# Altium footprint library connectors_terminal.PcbLib: 42 footprints (part 1 of 3)
Each footprint in its own frame and in the unit in brackets; x right, y up, seen from the top. Pads: shape width x height; smd on the part's side, far side on the other; paste and mask are expansions set on the pad; w line width, h text height; cw(c..) or ccw(c..) is an arc to the next point about the centre after c.
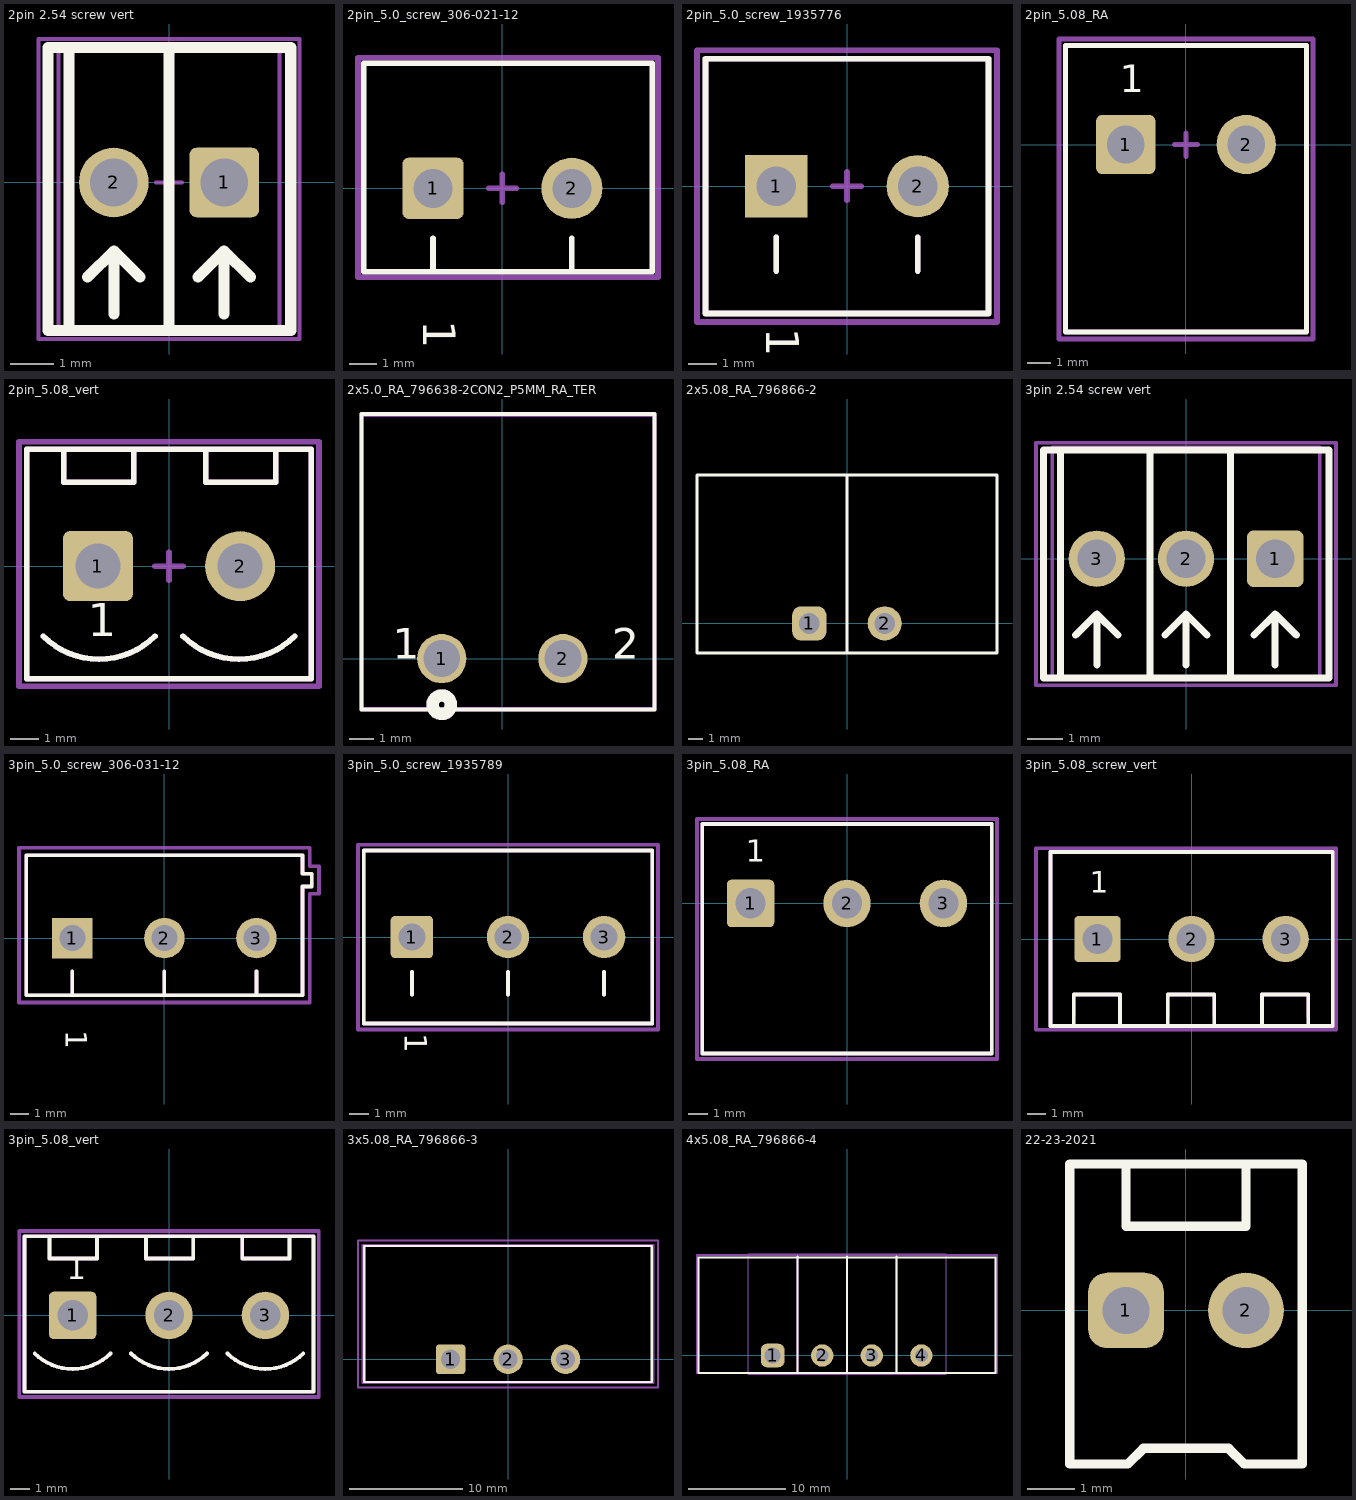
[diagram p0: the footprints below, top view; thin cyan lines are the x and y axes]

## 2pin 2.54 screw vert [mm] "XY308-2.54-02P, DG308-2.54-02P-14-00AH"
height 8
pads (2):
  rrect20% 1.6x1.6 hole 1.1: 1(1.27,0)
  round 1.6 hole 1.1: 2(-1.27,0)
Top Overlay:
  lines w0.254: -2.3,-3.4 -2.3,3.1 ; -1.87,-2.175 -1.27,-1.575 ; -1.27,-3.025 -1.27,-1.575 ; -0.67,-2.175 -1.27,-1.575 ; 0,-3.4 0,3.1 ; 0.67,-2.175 1.27,-1.575 ; 1.27,-3.025 1.27,-1.575 ; 1.87,-2.175 1.27,-1.575 ; -2.78,-3.4 -2.78,3.1 2.8,3.1 2.8,-3.4 -2.78,-3.4
M3_comm_top:
  text ".comment" at -0.9,-0.3 h1
M5_asm_top:
  lines w0.1: -2.54,-3.429 2.54,-3.429 2.54,3.175 -2.54,3.175 -2.54,-3.429
  text ".Designator" at -1.47,2.1 h1
M7_courtyard_top:
  lines w0.1: -0.3,0 0.3,0 ; 0,-0.4 0,0.4 ; -3,-3.6 -3,3.3 3,3.3 3,-3.6 -3,-3.6
M11_dimension:
  lines w0.1: -2.54,-3.429 -2.54,3.175 2.54,3.175 2.54,-3.429 -2.54,-3.429
3D body "DG308-2.54-2.SLDPRT": height 8.6, standoff -3.7, extent -2.75,-3.16 2.78,3.11

## 2pin_5.0_screw_306-021-12 [mm] "16Amper, KLS2-301-5.00-02P-2S (DG301-5.0-02P-12)"
height 10
pads (2):
  rrect20% 2.2x2.2 hole 1.4: 1(-2.5,0)
  round 2.2 hole 1.4: 2(2.5,0)
Top Overlay:
  lines w0.2: -2.5,-3 -2.5,-1.8 ; 2.5,-3 2.5,-1.8 ; -5,-3 5.4,-3 5.4,4.5 -5,4.5 -5,-3
  text "1" at -3.25,-4.75 h2
M3_comm_top:
  text ".comment" at -0.9,-0.3 h1
M5_asm_top:
  text ".Designator" at -1.5,1.8 h1
M7_courtyard_top:
  lines w0.2: -0.5,0 0.5,0 ; 0,-0.5 0,0.5 ; -5.2,-3.2 -5.2,4.7 5.6,4.7 5.6,-3.2 -5.2,-3.2
3D body "306-021-12.STEP": height 10.2, standoff -4, extent -5,-3.05 5.5,4.55

## 2pin_5.0_screw_1935776 [mm] "Phoenix Contact 1935776"
height 10
pads (2):
  rect 2.2x2.2 hole 1.4: 1(-2.5,0)
  round 2.2 hole 1.4: 2(2.5,0)
Top Overlay:
  lines w0.2: -2.5,-3 -2.5,-1.8 ; 2.5,-3 2.5,-1.8 ; -5,-4.5 5,-4.5 5,4.5 -5,4.5 -5,-4.5
  text "1" at -3.25,-5 h2
M3_comm_top:
  text ".comment" at -0.9,-0.3 h1
M5_asm_top:
  lines w0.2: -2.5,-3 -2.5,-1.8 ; 2.5,-3 2.5,-1.8 ; -5,-4.5 5,-4.5 5,4.5 -5,4.5 -5,-4.5
  text ".Designator" at -1.5,1.8 h1
M7_courtyard_top:
  lines w0.2: -0.5,0 0.5,0 ; 0,-0.5 0,0.5 ; -5.3,-4.8 -5.3,4.8 5.3,4.8 5.3,-4.8 -5.3,-4.8
3D body "pxc_1935776_00_PT-2-5-2-5-0-H_3D.stp": height 13.55, standoff -4.05, extent -5,-4.5 5,4.5

## 2pin_5.08_RA [mm] "KLS2-EDR-5.08-02P-4 (2EDGR-5.08-02P)  mating  KLS2-EDK-5.08-02P-4S (2ESDV-02P) (2EDGK-5.08-02P), Клеммник угловой, шаг 5.08мм, 2 контакта (15A 300V)"
height 10
pads (2):
  rrect20% 2.5x2.5 hole 1.6: 1(-2.54,0)
  round 2.5 hole 1.6: 2(2.54,0)
Top Overlay:
  lines w0.2: -5.08,-7.9 -5.08,4.175 5.08,4.175 5.08,-7.9 -5.08,-7.9
  text "1" at -2.8,1.8 h2
M3_comm_top:
  text ".comment" at -0.9,-0.3 h1
M5_asm_top:
  lines w0.2: -5.08,-7.9 5.08,-7.9 5.08,4.175 -5.08,4.175 -5.08,-7.9
  text ".Designator" at -1.3,1.55 h1
M7_courtyard_top:
  lines w0.2: -0.5,0 0.5,0 ; 0,-0.5 0,0.5 ; -5.36,-8.2 5.36,-8.2 5.36,2.4 5.36,3.9 5.36,4.45 -5.36,4.45 -5.36,-8.2
3D body "User Library-2EDGR-5_08-02P.step": height 8.25, standoff -3.94, extent -5.08,-7.925 5.08,4.175

## 2pin_5.08_vert [mm] "KLS2-EDV-5.08-02Р-4"
height 10
pads (2):
  rrect20% 2.5x2.5 hole 1.6: 1(-2.54,0)
  round 2.5 hole 1.6: 2(2.54,0)
Top Overlay:
  lines w0.2: -4.5,-2.5 ccw(c-2.5,-0.5) -0.5,-2.5 ; -3.76,4.175 -3.76,3 -1.26,3 -1.26,4.175 ; 0.5,-2.5 ccw(c2.5,-0.5) 4.5,-2.5 ; 1.32,4.175 1.32,3 3.82,3 3.82,4.175 ; -5.08,-4.025 5.08,-4.025 5.08,4.175 -5.08,4.175 -5.08,-4.025
  text "1" at -2.9,-2.9 h2
M3_comm_top:
  text ".comment" at -0.9,-0.3 h1
M5_asm_top:
  lines w0.2: -4.5,-2.5 ccw(c-2.5,-0.5) -0.5,-2.5 ; -3.76,4.175 -3.76,3 -1.26,3 -1.26,4.175 ; 0.5,-2.5 ccw(c2.5,-0.5) 4.5,-2.5 ; 1.32,4.175 1.32,3 3.82,3 3.82,4.175 ; -5.08,-4.025 -5.08,4.175 5.08,4.175 5.08,-4.025 -5.08,-4.025
  text ".Designator" at -1.3,1.55 h1
M7_courtyard_top:
  lines w0.2: -0.5,0 0.5,0 ; 0,-0.5 0,0.5 ; -5.36,-4.3 -5.36,4.45 5.36,4.45 5.36,3.9 5.36,2.4 5.36,-4.3 -5.36,-4.3
3D body "2EDGV-5.08-02P(моя версия).STEP": height 12.13, standoff -4.47, extent -5.08,-4.025 5.08,4.175

## 2x5.0_RA_796638-2CON2_P5MM_RA_TER [mil]
pads (2):
  round 80 / inner round 60 / far side round 80 hole 60: 1(-98.43,0) 2(98.43,0)
Top Overlay:
  lines w6: -228.98,-82.68 247.4,-82.68 247.4,397.64 -228.98,397.64 -228.98,-82.68
  lines w20: -99.97,-60.08 ccw(c-98.43,-75) -83.43,-75 ccw(c-98.43,-75) -96.88,-60.08
  text "1" at -178.43,0 h50
  text "1" at -178.43,0 h50
  text "2" at 178.43,0 h50
  text "2" at 178.43,0 h50
Bottom Overlay:
  circle w20: c-98.43,-75 r15
  text "1" at -178.43,0 h50
  text "1" at -178.43,0 h50
  text "2" at 178.43,0 h50
  text "2" at 178.43,0 h50
Mechanical 13:
  circle w20: c-98.43,-75 r15
  lines w1: -227.01,-78.74 -227.01,393.7 245.04,393.7 245.04,-78.74 -227.01,-78.74
  text "1" at -178.43,0 h50
  text "1" at -178.43,0 h50
  text "2" at 178.43,0 h50
  text "2" at 178.43,0 h50
Mechanical 15:
  lines w6: -228.98,-82.68 -228.98,397.64 247.4,397.64 247.4,-82.68 -228.98,-82.68
3D body: height 10, standoff 0, extent 58.43,0 68.43,10
3D body "c-796638-2-c3-3d.stp": height 330.71, standoff -135.83, extent -226.61,-78.74 245.04,393.7

## 2x5.08_RA_796866-2 [mm] "COMPATIBLE_796861-4_796863-4_796859-4"
height 0.025
pads (2):
  rrect50% 2.3x2.3 hole 1.4 mask+0.127: 1(-2.54,0)
  round 2.3 hole 1.4 mask+0.127: 2(2.54,0)
Top Overlay:
  lines w0.203: 0,-2 0,10 ; -10.1,-2 -10.1,10 10.1,10 10.1,-2 -10.1,-2
3D body "796866-2.stp": height 8.4, standoff -3.45, extent -10.12,-2 10.12,10

## 3pin 2.54 screw vert [mm] "XY308-2.54-03P, DG308-2.54-03P-14-00AH"
height 8
pads (3):
  rrect20% 1.6x1.6 hole 1.1: 1(2.54,0)
  round 1.6 hole 1.1: 2(0,0) 3(-2.54,0)
Top Overlay:
  lines w0.2: -4.05,3.1 -4.05,-3.4 4.07,-3.4 4.07,3.1 -4.02,3.1 ; -3.57,-3.4 -3.57,3.1 ; -3.14,-2.175 -2.54,-1.575 ; -2.54,-3.025 -2.54,-1.575 ; -1.94,-2.175 -2.54,-1.575 ; -1.03,-3.4 -1.03,3.1 ; -0.6,-2.175 0,-1.575 ; 0,-3.025 0,-1.575 ; 0.6,-2.175 0,-1.575 ; 1.27,-3.4 1.27,3.1 ; 1.94,-2.175 2.54,-1.575 ; 2.54,-3.025 2.54,-1.575 ; 3.14,-2.175 2.54,-1.575
M3_comm_top:
  text ".Comment" at 0,0 h0.5
M5_asm_top:
  lines w0.1: -3.81,-3.429 -3.81,3.175 3.81,3.175 3.81,-3.429 -3.81,-3.429
  text ".Designator" at -1.125,3.675 h1
M7_courtyard_top:
  lines w0.1: -0.3,0 0.3,0 ; 0,-0.4 0,0.4 ; -4.27,-3.6 -4.27,3.3 ; -4.27,-3.6 -4.27,3.3 ; -4.27,-3.6 4.27,-3.6 4.27,3.3 -4.27,3.3
3D body "DG308-2.54-2.SLDPRT": height 8.6, standoff -3.7, extent -4.02,-3.16 1.51,3.11
3D body "DG308-2.54-2.SLDPRT": height 8.6, standoff -3.7, extent -1.48,-3.16 4.05,3.11

## 3pin_5.0_screw_306-031-12 [mm] "306-031-12"
height 10
pads (3):
  rect 2.2x2.2 hole 1.4: 1(-5,0)
  round 2.2 hole 1.4: 2(0,0) 3(5,0)
Top Overlay:
  lines w0.2: -5,-3 -5,-1.8 ; 0,-3 0,-1.8 ; 5,-3 5,-1.8 ; -7.5,-3.1 7.5,-3.1 7.5,2.8 8,2.8 8,3.5 7.5,3.5 7.5,4.5 -7.5,4.5 -7.5,-3.1
  text "1" at -5.75,-5 h2
M3_comm_top:
  text ".comment" at -0.9,-0.3 h1
M5_asm_top:
  lines w0.2: -5,-3 -5,-1.8 ; 0,-3 0,-1.8 ; 5,-3 5,-1.8 ; -7.5,-3.1 -7.5,4.5 7.5,4.5 7.5,3.5 8,3.5 8,2.8 7.5,2.8 7.5,-3.1 -7.5,-3.1
  text ".Designator" at -1,1.3 h1
M7_courtyard_top:
  lines w0.2: -0.5,0 0.5,0 ; 0,-0.5 0,0.5 ; -7.9,-3.5 7.9,-3.5 7.9,2.4 8.4,2.4 8.4,3.9 7.9,3.9 7.9,4.9 -7.9,4.9 -7.9,-3.5
3D body "305-031-12.STEP": height 10.25, standoff -4.05, extent -7.5,-3.1 8,4.5

## 3pin_5.0_screw_1935789 [mm] "Phoenix Contact 1935789"
height 10
pads (3):
  rrect20% 2.2x2.2 hole 1.4: 1(-5,0)
  round 2.2 hole 1.4: 2(0,0) 3(5,0)
Top Overlay:
  lines w0.2: -5,-3 -5,-1.8 ; 0,-3 0,-1.8 ; 5,-3 5,-1.8 ; -7.5,-4.5 7.5,-4.5 7.5,4.5 -7.5,4.5 -7.5,-4.5
  text "1" at -5.75,-5 h2
M3_comm_top:
  text ".comment" at -0.9,-0.3 h1
M5_asm_top:
  lines w0.2: -5,-3 -5,-1.8 ; 0,-3 0,-1.8 ; 5,-3 5,-1.8 ; -7.5,-4.5 7.5,-4.5 7.5,4.5 -7.5,4.5 -7.5,-4.5
  text ".Designator" at -1.5,1.8 h1
M7_courtyard_top:
  lines w0.2: -0.5,0 0.5,0 ; 0,-0.5 0,0.5 ; -7.8,-4.8 -7.8,4.8 7.8,4.8 7.8,-4.8 -7.8,-4.8
3D body "pxc_1935789_00_PT-2-5-3-5-0-H_3D.stp": height 13.55, standoff -4.05, extent -7.5,-4.5 7.5,4.5

## 3pin_5.08_RA [mm] "KLS2-EDR-5.08-03P-4 (2EDGR-5.08-03P)  mating  KLS2-EDK-5.08-03P-4S (2ESDV-03P) (2EDGK-5.08-03P), Клеммник угловой, шаг 5.08мм, 3 контакта (15A 300V)"
height 10
pads (3):
  rrect20% 2.5x2.5 hole 1.6: 1(-5.08,0)
  round 2.5 hole 1.6: 2(0,0) 3(5.08,0)
Top Overlay:
  lines w0.2: -7.62,-7.9 7.62,-7.9 7.62,4.175 -7.62,4.175 -7.62,-7.9
  text "1" at -5.34,1.8 h2
M3_comm_top:
  text ".comment" at -0.9,-0.3 h1
M5_asm_top:
  lines w0.2: -7.62,-7.9 -7.62,4.175 7.62,4.175 7.62,-7.9 -7.62,-7.9
  text ".Designator" at -1.3,1.55 h1
M7_courtyard_top:
  lines w0.2: -0.5,0 0.5,0 ; 0,-0.5 0,0.5 ; -7.9,-8.2 -7.9,4.45 7.9,4.45 7.9,3.9 7.9,2.4 7.9,-8.2 -7.9,-8.2
3D body "User Library-2EDGR-5_08-02P.step": height 8.25, standoff -3.94, extent -7.62,-7.925 2.54,4.175
3D body "User Library-2EDGR-5_08-02P.step": height 8.25, standoff -3.94, extent -2.54,-7.925 7.62,4.175

## 3pin_5.08_screw_vert [mm] "MKDSN 2,5/ 3-5,08 - 1888690, DG129-5.08-03P-14-00A(H)"
height 10
pads (3):
  rrect20% 2.5x2.5 hole 1.6: 1(-5.08,0)
  round 2.5 hole 1.6: 2(0,0) 3(5.08,0)
Top Overlay:
  lines w0.2: -6.36,-4.7 -6.36,-3 -3.86,-3 -3.86,-4.7 ; -1.28,-4.7 -1.28,-3 1.22,-3 1.22,-4.7 ; 3.8,-4.7 3.8,-3 6.3,-3 6.3,-4.7 ; -7.62,-4.7 -7.62,4.7 7.62,4.7 7.62,-4.7 -7.62,-4.7
  text "1" at -5.5,2.1 h2
M3_comm_top:
  text ".comment" at -0.9,-0.3 h1
M5_asm_top:
  lines w0.2: -6.36,-4.175 -6.36,-3 -3.86,-3 -3.86,-4.175 ; -1.28,-4.175 -1.28,-3 1.22,-3 1.22,-4.175 ; 3.8,-4.175 3.8,-3 6.3,-3 6.3,-4.175 ; -7.62,-4.7 7.62,-4.7 7.62,4.7 -7.62,4.7 -7.62,-4.7
  text ".Designator" at -1,1.3 h1
M7_courtyard_top:
  lines w0.2: -0.5,0 0.5,0 ; 0,-0.5 0,0.5 ; -8.4,-4.9 7.8,-4.9 7.8,4.9 -8.4,4.9 -8.4,-4.9
3D body "pxc_1888690_02_MKDSN-2-5-3-5-08_3D.stp": height 15.03, standoff -3.47, extent -8.185,-4.75 7.625,4.75

## 3pin_5.08_vert [mm] "KLS2-EDV-5.08-03Р-4"
height 10
pads (3):
  rrect20% 2.5x2.5 hole 1.6: 1(-5.08,0)
  round 2.5 hole 1.6: 2(0,0) 3(5.08,0)
Top Overlay:
  lines w0.2: -7.08,-2 ccw(c-5.08,0) -3.08,-2 ; -6.3,4.175 -6.3,3 -3.8,3 -3.8,4.175 ; -2,-2 ccw(c0,0) 2,-2 ; -1.22,4.175 -1.22,3 1.28,3 1.28,4.175 ; 3.08,-2 ccw(c5.08,0) 7.08,-2 ; 3.86,4.175 3.86,3 6.36,3 6.36,4.175 ; -7.62,-4.025 7.62,-4.025 7.62,4.175 -7.62,4.175 -7.62,-4.025
  text "1" at -5.4,1.5 h2
M3_comm_top:
  text ".comment" at -0.9,-0.3 h1
M5_asm_top:
  lines w0.2: -7.08,-2 ccw(c-5.08,0) -3.08,-2 ; -6.3,4.175 -6.3,3 -3.8,3 -3.8,4.175 ; -2,-2 ccw(c0,0) 2,-2 ; -1.22,4.175 -1.22,3 1.28,3 1.28,4.175 ; 3.08,-2 ccw(c5.08,0) 7.08,-2 ; 3.86,4.175 3.86,3 6.36,3 6.36,4.175 ; 7.6,-4.025 -7.62,-4.025 -7.62,4.175 7.6,4.175 ; 7.62,-4.025 7.62,4.175
  text ".Designator" at -1,1.3 h1
M7_courtyard_top:
  lines w0.2: -0.5,0 0.5,0 ; 0,-0.5 0,0.5 ; -7.9,-4.3 -7.9,4.45 7.9,4.45 7.9,3.9 7.9,2.4 7.9,-4.3 -7.9,-4.3
3D body "2EDGV-5.08-03P(моя вресия).STEP": height 12.13, standoff -4.47, extent -7.62,-4.025 7.62,4.175

## 3x5.08_RA_796866-3 [mm] "COMPATIBLE_796861-3_796863-3_796859-3"
height 0.025
pads (3):
  rrect20% 2.6x2.6 hole 1.7 mask+0.127: 1(-5.08,0)
  round 2.6 hole 1.7 mask+0.127: 2(0,0) 3(5.08,0)
Top Overlay:
  lines w0.2: -12.7,-2 -7.398,-2
  lines w0.203: -12.7,-2 -12.7,10 12.7,10 12.7,-2 -7.398,-2
M5_asm_top:
  lines w0.203: -12.84,-2.1 -12.84,10.1 12.84,10.1 12.84,-2.1 -12.84,-2.1
  text "1" at -5.46,2 h2
M7_courtyard_top:
  lines w0.2: -1,0 1,0 ; 0,-1 0,1
  lines w0.203: -13.26,-2.5 13.24,-2.5 13.24,10.5 -13.26,10.5 -13.26,-2.5
3D body "796866-3-b1-3d.stp": height 8.4, standoff -3.45, extent -12.66,-2 12.66,10

## 4x5.08_RA_796866-4 [mil] "COMPATIBLE_796861-4_796863-4_796859-4"
height 1
pads (4):
  rrect50% 95x95 hole 65 mask+5: 1(-300,0)
  round 90 hole 52 mask+5: 2(-100,0) 3(100,0) 4(300,0)
Top Overlay:
  lines w7.87: -600,-70 -400,-70
  lines w8: -600,-70 -600,395 600,395 600,-70 -400,-70 ; -200,-70 -200,400 ; 0,-70 0,400 ; 200,-70 200,400
M1_3D_TOP:
  lines w1: -398,-75 400,-75 400,410 -398,410 -398,-75
  lines w8: -200,-65 -200,400 ; 0,-70 0,405 ; 200,-70 200,400 ; -605.51,-70 605.51,-70 605.51,405 -605.51,405 -605.51,-70
3D body "c-796866-4-b1-3d.stp": height 334.65, standoff -131.89, extent -599.21,-78.74 597.64,393.7
3D body "c-796859-4-e1-3d.stp": height 620.08, standoff 9.84, extent -592.91,326.77 592.91,1051.18

## 22-23-2021 [mm] "Headers & Wire Housings VERT PCB HDR 2P TIN FRICTION LOCK"
height 0.025
pads (2):
  rrect50% 1.6x1.6 hole 1: 1(-1.27,0)
  round 1.6 hole 1: 2(1.27,0)
Top Overlay:
  lines w0.2: -1.27,3.099 -1.27,1.778 1.27,1.778 1.27,3.099 ; -2.464,-3.251 -1.232,-3.251 -0.902,-2.921 0.902,-2.921 1.232,-3.251 2.464,-3.251 2.464,3.099 -2.464,3.099 -2.464,-3.251
3D body "22-23-2021_022232021.stp": height 10.73, standoff -3.49, extent -2.464,-3.251 2.464,3.099